# Altium footprint library Standard.PcbLib: 149 footprints (part 4 of 10)
Each footprint in its own frame and in the unit in brackets; x right, y up, seen from the top. Pads: shape width x height; smd on the part's side, far side on the other; paste and mask are expansions set on the pad; w line width, h text height; cw(c..) or ccw(c..) is an arc to the next point about the centre after c.
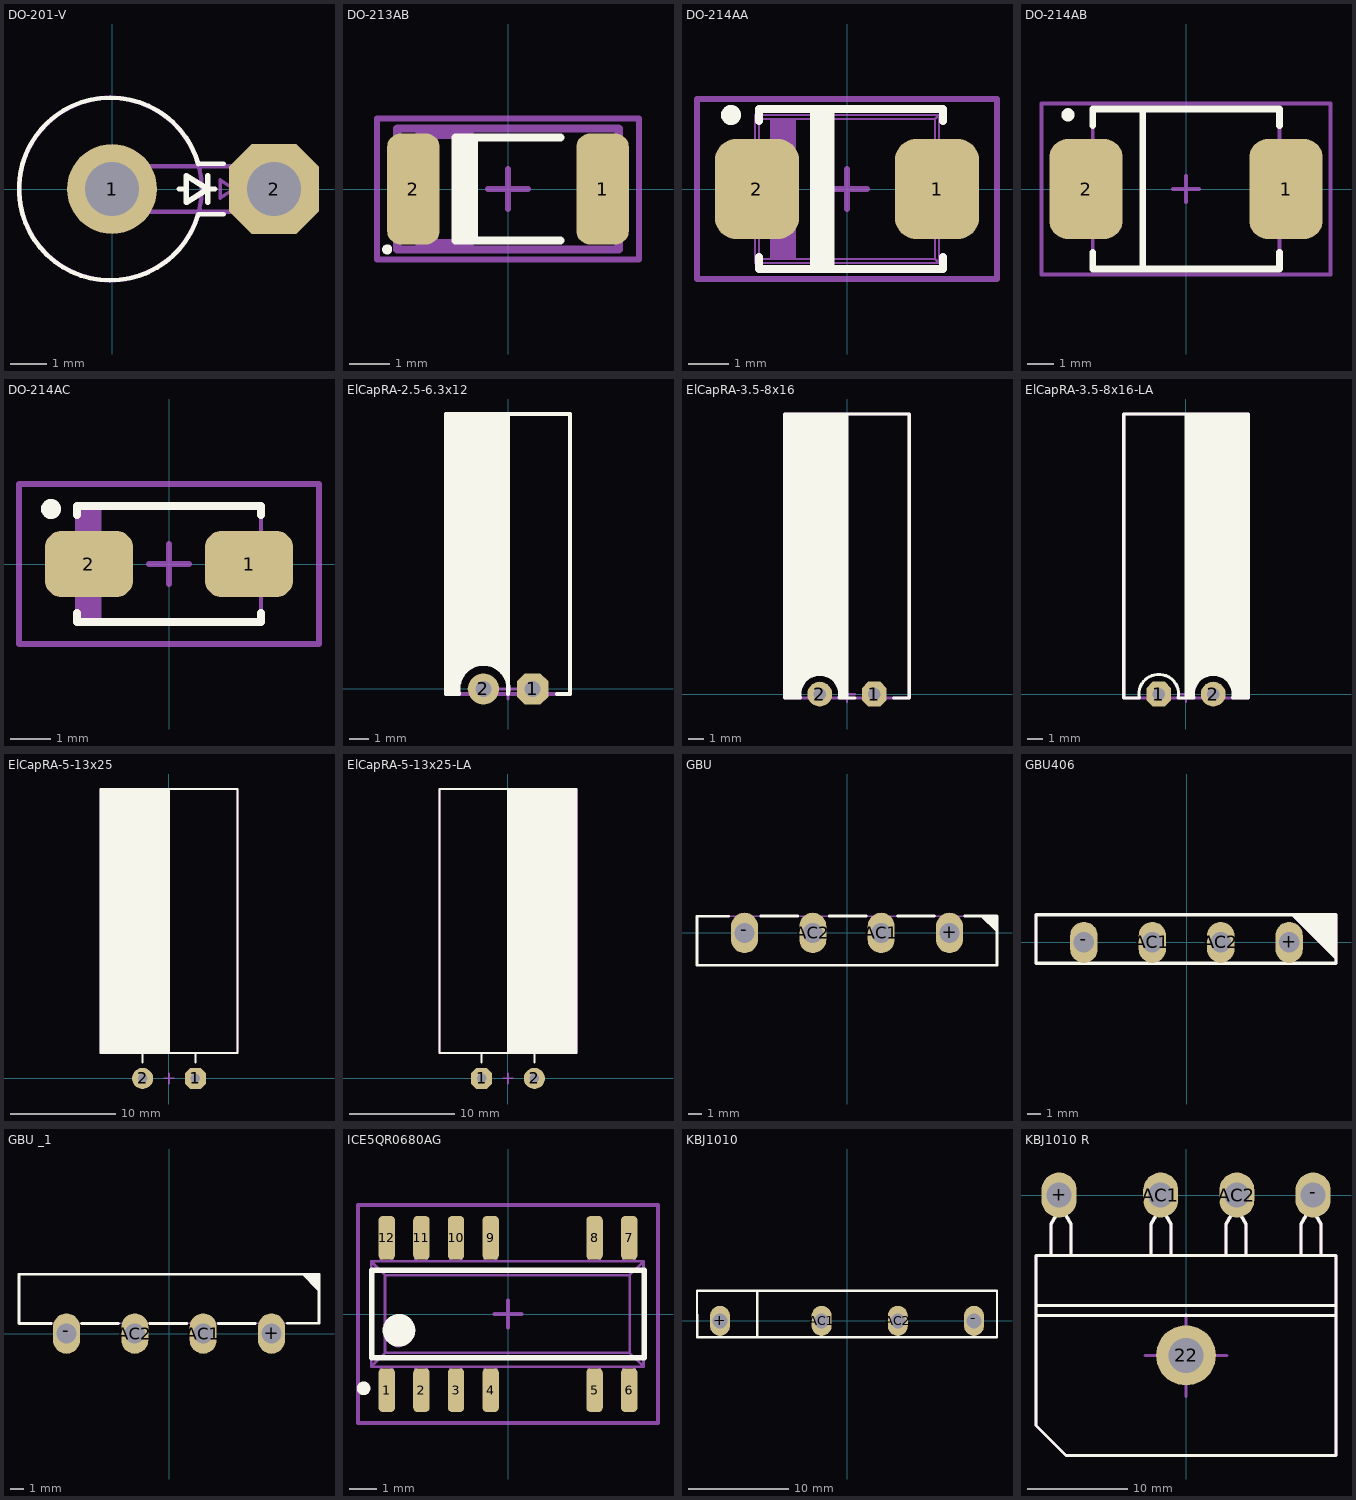
[diagram p3: the footprints below, top view; thin cyan lines are the x and y axes]

## DO-201-V [mm]
pads (2):
  round 2.5 hole 1.5: 1(0,0)
  oct 2.5x2.5 hole 1.5: 2(4.5,0)
Top Overlay:
  lines w0.125: 2.397,-0.699 cw(c-0.045,0) 2.399,0.692 ; 2.4,-0.7 3.1,-0.7 ; 2.4,0.7 3.1,0.7
  lines w0.15: 1.86,0 2.06,0 ; 2.06,-0.371 2.06,0.376 2.66,0 ; 2.065,-0.376 2.66,0 ; 2.66,-0.373 2.66,0.373 ; 2.86,0 2.66,0
Top Assembly:
  circle w0.125: c-0.045,0 r2.535
  lines w0.1: 3.389,-0.254 3.389,0.254 ; 3.008,-0.254 3.008,0.254 3.389,0 3.008,-0.254
  lines w0.125: 4.913,-0.635 ccw(c4.913,0) 4.913,0.635 ; 5.04,-0.635 -0.04,-0.635 cw(c-0.04,0) -0.04,0.635 5.04,0.635
3D body "DO-201-200 Ver.STEP": height 11.55, standoff -1.55, extent -2.84,-2.8 5.64,2.8

## DO-213AB [mm] "MELF Diode, 2-Leads, Body 5,00x2,50mm, IPC Medium Density"
height 2.6
pads (2):
  rrect50% 1.3x2.75 smd: 1(2.35,0) 2(-2.35,0)
Top Overlay:
  circle w0.15: c-3,-1.5 r0.05
  region: -0.75,1.275 -1.3,1.275 -1.3,-1.275 -0.75,-1.275
  lines w0.2: 1.3,-1.275 -1.3,-1.275 -1.3,1.275 1.3,1.275
Top Assembly:
  region: -1.75,1.5 -2.3,1.5 -2.3,-1.5 -1.75,-1.5
  region: -1.75,-1.25 -1,-1.25 -0.75,-1.5 -1.75,-1.5
  region: -1.75,1.25 -1,1.25 -0.75,1.5 -1.75,1.5
  lines w0.2: -2.75,-1.5 2.75,-1.5 2.75,1.5 -2.75,1.5 -2.75,-1.5
Top Component Outline:
  lines w0.15: -0.5,0 0.5,0 ; 0,-0.5 0,0.5 ; -3.25,-1.75 3.25,-1.75 3.25,1.75 -3.25,1.75 -3.25,-1.75
3D body "MELF.STEP": height 2.5, standoff 0, extent -2.616,-1.25 2.384,1.25

## DO-214AA [mm] "SMB, Molded Diode, 2-Leads, Body 4,33x3,65mm, IPC Medium Density"
height 2.4
pads (2):
  rrect50% 2.1x2.5 smd: 1(2.25,0) 2(-2.25,0)
Top Overlay:
  circle w0.25: c-2.9,1.85 r0.125
  rectangle: -0.93,-2 -0.311,2
  lines w0.2: -2.2,-1.7 -2.2,-2 2.4,-2 2.4,-1.7 ; -2.2,1.7 -2.2,2 2.4,2 2.4,1.7
Top Assembly:
  region: -1.3,1.75 -1.9,1.75 -1.9,-1.75 -1.3,-1.75
  lines w0.05: -2.4,-1 -2.3,-1 ; -2.4,-1 -2.65,-1 -2.65,1 -2.4,1 ; -2.4,-1 -2.4,1 ; -2.4,1 -2.3,1 ; -2.3,-1.85 -2.2,-1.75 ; -2.3,-1.85 -2.3,-1 ; -2.3,-1.85 2.3,-1.85 ; -2.3,-1 -2.3,1 ; -2.3,1 -2.3,1.85 ; -2.3,1.85 -2.2,1.75 ; -2.3,1.85 2.3,1.85 ; -2.2,-1.75 -2.2,1.75 ; -2.2,-1.75 -1.9,-1.75 ; -2.2,1.75 -1.9,1.75 ; -1.9,-1.75 -1.3,-1.75 ; -1.9,-1.75 -1.9,1.75 ; -1.9,1.75 -1.3,1.75 ; -1.3,-1.75 -1.3,1.75 ; -1.3,-1.75 2.2,-1.75 ; -1.3,1.75 2.2,1.75 ; 2.2,-1.75 2.3,-1.85 ; 2.2,-1.75 2.2,1.75 ; 2.2,1.75 2.3,1.85 ; 2.3,-1.85 2.3,-1 ; 2.3,-1 2.4,-1 ; 2.3,-1 2.3,1 ; 2.3,1 2.3,1.85 ; 2.3,1 2.4,1 ; 2.4,-1 2.65,-1 2.65,1 2.4,1 ; 2.4,-1 2.4,1
Top Component Outline:
  lines w0.15: -0.5,0 0.5,0 ; 0,-0.5 0,0.5 ; -3.75,-2.25 3.75,-2.25 3.75,2.25 -3.75,2.25 -3.75,-2.25
3D body "SMB (DO-214AA).STEP": height 2.2, standoff -0.05, extent -2.65,-1.85 2.65,1.85

## DO-214AB [mil] "SMC"
height 94.49
pads (2):
  rrect50% 110x150 smd: 1(150,0) 2(-150,0)
Top Overlay:
  circle w10: c-177.01,111.27 r4.92
  lines w10: -139.84,-95 -139.84,-120 140.16,-120 140.16,-95 ; -139.84,95 -139.84,120 140.16,120 140.16,95 ; -64.84,-120 -64.84,120
Top Assembly:
  lines w5.91: -64.84,-120 -64.84,120 ; -139.84,-120 140.16,-120 140.16,120 -139.84,120 -139.84,-120
Top Component Outline:
  lines w5.91: -19.69,0.08 19.68,0.08 ; 0,-19.61 0,19.76 ; -216.54,-127.95 216.54,-127.95 216.54,127.95 -216.54,127.95 -216.54,-127.95
3D body "User Library-DIOM8261X24.STEP": height 94.49, standoff 1.29, extent -160.04,-120 160.04,120.16

## DO-214AC [mm] "SMA 2-Leads, Body 2,55x5,00mm, IPC Medium Density"
height 1.1
pads (2):
  rrect50% 2.2x1.65 smd: 1(2,0) 2(-2,0)
Top Overlay:
  circle w0.25: c-2.95,1.375 r0.125
  lines w0.2: -2.3,-1.225 -2.3,-1.45 2.3,-1.45 2.3,-1.225 ; -2.3,1.225 -2.3,1.45 2.3,1.45 2.3,1.225
Top Assembly:
  rectangle: -2.3,-1.45 -1.681,1.45
  lines w0.1: -2.3,-1.45 2.3,-1.45 2.3,1.45 -2.3,1.45 -2.3,-1.45
Top Component Outline:
  lines w0.15: -0.5,0 0.5,0 ; 0,-0.5 0,0.5 ; -3.75,-2 3.75,-2 3.75,2 -3.75,2 -3.75,-2
3D body "User Library-S1G-1.step": height 2.7, standoff 0, extent -2.8,-1.475 2.8,1.475

## ElCapRA-2.5-6.3x12 [mm]
height 12
pads (2):
  oct 1.6x1.6 hole 0.8: 1(1.25,0)
  round 1.6 hole 0.8: 2(-1.25,0)
Top Overlay:
  region: 0,14 -3.15,14 -3.15,1.25 0,1.25
  rectangle: -3.125,-0.25 -2.5,1.5
  region: -2.725,1.625 -1.375,1.625 -3.063,-0.063
  region: -0.125,1.406 -0.868,1.406 0.061,0.478
  lines w0.2: 0,14.001 0,-0.25 ccw(c-1.25,0) -2.5,-0.25 -3.15,-0.25 -3.15,14 3.15,14 3.15,-0.25 2.5,-0.25
Top Assembly:
  lines w0.2: -3.151,-0.25 3.15,-0.25 3.15,14.001 -3.151,14.001 -3.151,-0.25
Top Component Outline:
  lines w0.15: -0.5,0 0.5,0 ; 0,-0.5 0,0.5
3D body "ElCapRA-2.5-6.3x12.step": height 6.4, standoff -3, extent -3.151,-0.249 3.15,14.001

## ElCapRA-3.5-8x16 [mm]
height 12
pads (2):
  oct 1.6x1.6 hole 0.8: 1(1.75,0)
  round 1.6 hole 0.8: 2(-1.75,0)
Top Overlay:
  region: 0,18 -4,18 -4,1.2 0,1.2
  region: 0,1.5 -0.5,1.5 -0.5,-0.25 0,-0.25
  rectangle: -4,-0.25 -3,1.5
  region: -0.5,1.5 -1.5,1.5 -0.25,0.25
  region: -3,1.5 -2,1.5 -3.25,0.25
  lines w0.2: 0,-0.25 0,18 ; 0.5,-0.25 -0.5,-0.25 ccw(c-1.75,0) -3,-0.25 ; 3,-0.25 4,-0.25 4,18 -4,18 ; -4,-0.25 -4,18 ; -4,-0.25 -3,-0.25 ; -4,-0.25 -4,18 ; -4,-0.25 -3,-0.25
Top Assembly:
  lines w0.2: -4,-0.25 -4,18 ; -4,-0.25 -4,18 ; -4,-0.25 4,-0.25 4,18 -4,18
Top Component Outline:
  lines w0.15: -0.5,0 0.5,0 ; 0,-0.5 0,0.5
3D body "ElCapRA-3.5-8x16.step": height 8.1, standoff -3, extent -4.001,-0.249 4,18.001

## ElCapRA-3.5-8x16-LA [mm]
height 12
pads (2):
  oct 1.6x1.6 hole 0.8: 1(-1.75,0)
  round 1.6 hole 0.8: 2(1.75,0)
Top Overlay:
  rectangle: 0,1.2 4,18
  rectangle: 0,-0.25 0.5,1.5
  region: 4,1.5 3,1.5 3,-0.25 4,-0.25
  region: 0.5,1.5 1.5,1.5 0.25,0.25
  region: 3,1.5 2,1.5 3.25,0.25
  lines w0.2: -4,-0.25 -4,18 ; -4,-0.25 -3,-0.25 ; -4,-0.25 -4,18 ; -4,-0.25 -3,-0.25 ; -4,18 4,18 ; -3,-0.25 cw(c-1.75,0) -0.5,-0.25 0.5,-0.25 cw(c1.75,0) 3,-0.25 ; 3,-0.25 4,-0.25 ; 3,-0.25 4,-0.25 ; 3,-0.25 4,-0.25 ; 4,-0.25 4,18 ; 4,-0.25 4,18 ; 4,-0.25 4,18 ; 0,-0.25 0,18 0,-0.25
Top Assembly:
  lines w0.2: -4,-0.25 -4,18 ; -4,-0.25 -4,18 ; -4,-0.25 4,-0.25 4,18 -4,18
Top Component Outline:
  lines w0.15: -0.5,0 0.5,0 ; 0,-0.5 0,0.5
3D body "ElCapLA-3.5-8x16.step": height 8.1, standoff -3, extent -4,-0.249 4.001,18.001

## ElCapRA-5-13x25 [mm]
height 25
pads (2):
  oct 2x2 hole 0.9: 1(2.5,0)
  round 2 hole 0.9: 2(-2.5,0)
Top Overlay:
  rectangle: -6.5,2.401 0,27.401
  lines w0.2: -2.5,1.5 -2.5,2.401 ; 0.001,2.401 0.001,27.401 ; 2.5,1.5 2.5,2.401 ; -6.5,2.401 6.501,2.401 6.501,27.401 -6.5,27.401 -6.5,2.401
Top Assembly:
  lines w0.2: -6.5,2.401 6.501,2.401 6.501,27.401 -6.5,27.401 -6.5,2.401
Top Component Outline:
  lines w0.15: -0.5,0 0.5,0 ; 0,-0.5 0,0.5
3D body "ElCapRA-5.0-13x25.step": height 13.1, standoff -3, extent -6.501,-0.299 6.5,27.401

## ElCapRA-5-13x25-LA [mm]
height 25
pads (2):
  oct 2x2 hole 0.9: 1(-2.5,0)
  round 2 hole 0.9: 2(2.5,0)
Top Overlay:
  rectangle: 0.001,2.401 6.5,27.401
  lines w0.2: -2.5,1.5 -2.5,2.401 ; 0.001,2.401 0.001,27.401 ; 2.5,1.5 2.5,2.401 ; -6.5,2.401 -6.5,27.401 6.501,27.401 6.501,2.401 -6.5,2.401
Top Assembly:
  lines w0.2: -6.5,2.401 -6.5,27.401 6.501,27.401 6.501,2.401 -6.5,2.401
Top Component Outline:
  lines w0.15: -0.5,0 0.5,0 ; 0,-0.5 0,0.5
3D body "ElCapLA-5.0-13x25.step": height 13.1, standoff -3, extent -6.5,-0.299 6.501,27.401

## GBU [mm]
pads (4):
  oval 2x3 hole 1.5: +(7.62,0) -(-7.62,0) AC1(2.54,0) AC2(-2.54,0)
Top Overlay:
  region: 9.91,1.25 11.15,1.25 11.15,0.06 11.125,0.035
  lines w0.2: -8.8,1.23 -11.15,1.23 -11.15,-2.41 11.15,-2.41 11.15,1.25 8.758,1.25 ; -6.41,1.25 -3.66,1.25 ; -1.33,1.25 1.42,1.25 ; 3.75,1.25 6.5,1.25
Top Assembly:
  region: 11.15,1.25 11.15,0.3 11.1,0.3 10.15,1.25
  lines w0.1: -11.15,-2.41 -11.15,1.25 11.15,1.25 11.15,-2.41 10.91,-2.41 -11.15,-2.41
3D body "GBU.stp": height 22, standoff -4.55, extent -11.15,-2.41 11.15,1.25

## GBU406 [mm]
pads (4):
  oval 2x3 hole 1.5: +(7.5,0) -(-7.5,0) AC1(-2.5,0) AC2(2.5,0)
Top Overlay:
  region: 10.922,2.032 10.922,-1.27 7.62,2.032
  lines w0.254: -11,-1.524 -11,2.032 6.858,2.032 10.922,2.032 10.922,-1.524 -11,-1.524
Top Assembly:
  region: 10.922,2.032 10.922,-1.27 7.62,2.032
  lines w0.2: -11,-1.524 -11,2.032 10.922,2.032 10.922,-1.524 -11,-1.524
3D body "User Library-Silicon Bridge Rectifiers GBU406.step": height 25.25, standoff -11.25, extent -11,-1.524 11,2.026

## GBU _1 [mm]
pads (4):
  oval 2x3 hole 1.5: +(7.62,0) -(-7.62,0) AC1(2.54,0) AC2(-2.54,0)
Top Overlay:
  region: 9.86,4.4 11.1,4.4 11.1,3.21 11.075,3.185
  lines w0.2: -8.758,0.75 -11.15,0.75 -11.15,4.41 11.15,4.41 11.15,0.77 8.8,0.77 ; -6.5,0.75 -3.75,0.75 ; -1.42,0.75 1.33,0.75 ; 3.66,0.75 6.41,0.75
Top Assembly:
  region: 11.15,4.41 11.15,3.46 11.1,3.46 10.15,4.41
  lines w0.1: -11.15,0.75 11.15,0.75 11.15,4.41 -10.91,4.41 -11.15,4.41 -11.15,0.75
3D body "User Library-GBU10A-1.STEP": height 23.8, standoff 5, extent -11.15,0.75 11.15,4.36

## ICE5QR0680AG [mm] "SOIC, 12-Leads, ICE5QR0680AG"
height 1.75
pads (12):
  rrect50% 0.6x1.6 smd: 1(-4.458,-2.794) 2(-3.188,-2.794) 3(-1.918,-2.794) 4(-0.648,-2.794) 5(3.162,-2.794) 6(4.432,-2.794) 7(4.432,2.794) 8(3.162,2.794) 9(-0.648,2.794) 10(-1.918,2.794) 11(-3.188,2.794) 12(-4.458,2.794)
Top Overlay:
  circle w0.25: c-5.308,-2.725 r0.125
  circle w0.6: c-4.013,-0.6 r0.3
  lines w0.2: -5.013,-1.6 4.987,-1.6 4.987,1.6 -5.013,1.6 -5.013,-1.6
Top Assembly:
  drawing of 212 lines, arcs and shapes, not listed
Top Component Outline:
  lines w0.15: -0.513,0 0.487,0 ; -0.013,-0.5 -0.013,0.5 ; -5.513,-4 5.487,-4 5.487,4 -5.513,4 -5.513,-4
3D body "ICE5QR0680AG.STEP": height 1.7, standoff -0.05, extent -5.013,-2.9 4.987,2.9

## KBJ1010 [mm]
pads (4):
  oval 2x3 hole 1.5: +(-12.7,0) -(12.7,0) AC1(-2.54,0) AC2(5.08,0)
Top Overlay:
  lines w0.2: -9,-1.625 -9,3 ; -15,-1.625 15,-1.625 15,3 -15,3 -15,-1.625
  lines w0.25: -9,-1.625 -9,3 ; -15,-1.625 15,-1.625 15,3 -15,3 -15,-1.625
3D body "User Library-Silicon Bridge Rectifiers KBJ1010.step": height 23.85, standoff -13.35, extent -15,-1.8 15,3

## KBJ1010 R [mm]
pads (5):
  round 6 hole 3.5: 22(-0.009,-16.043)
  oval 3.5x4.5 hole 2.5: +(-12.7,0) -(12.7,0) AC1(-2.54,0) AC2(5.08,0)
Top Overlay:
  lines w0.3: -13.509,-6.043 -13.509,-2.909 -13.009,-2.043 -13.009,-0.343 ; -11.509,-6.043 -11.509,-2.909 -12.009,-2.043 -12.009,-0.343 ; -3.509,-6.043 -3.509,-2.909 -3.009,-2.043 -3.009,-0.343 ; -1.509,-6.043 -1.509,-2.909 -2.009,-2.043 -2.009,-0.343 ; 3.991,-6.043 3.991,-2.909 4.491,-2.043 4.491,-0.343 ; 5.991,-6.043 5.991,-2.909 5.491,-2.043 5.491,-0.343 ; 11.491,-6.043 11.491,-2.909 11.991,-2.043 11.991,-0.343 ; 13.491,-6.043 13.491,-2.909 12.991,-2.043 12.991,-0.343 ; -15.009,-12.043 14.991,-12.043 ; -15.009,-12.043 -15.009,-11.043 ; -15.009,-12.043 -15.009,-23.043 -12.009,-26.043 14.991,-26.043 14.991,-12.043 ; -15.009,-11.043 -15.009,-6.043 14.991,-6.043 14.991,-11.043 ; -15.009,-11.043 14.991,-11.043 ; -13.009,-0.343 -13.009,0.007 ; -13.009,-0.343 -12.009,-0.343 ; -13.009,0.007 -13.009,0.707 -12.609,0.707 ; -13.009,0.007 -12.609,0.007 ; -12.609,0.007 -12.609,0.707 ; -12.609,0.007 -12.409,0.007 ; -12.609,0.707 -12.409,0.707 ; -12.409,0.007 -12.409,0.707 ; -12.409,0.007 -12.009,0.007 ; -12.409,0.707 -12.009,0.707 -12.009,0.007 ; -12.009,-0.343 -12.009,0.007 ; -3.009,-0.343 -3.009,0.007 ; -3.009,-0.343 -2.009,-0.343 ; -3.009,0.007 -3.009,0.707 -2.609,0.707 ; -3.009,0.007 -2.609,0.007 ; -2.609,0.007 -2.609,0.707 ; -2.609,0.007 -2.409,0.007 ; -2.609,0.707 -2.409,0.707 ; -2.409,0.007 -2.409,0.707 ; -2.409,0.007 -2.009,0.007 ; -2.409,0.707 -2.009,0.707 -2.009,0.007 ; -2.009,-0.343 -2.009,0.007 ; 4.491,-0.343 4.491,0.007 ; 4.491,-0.343 5.491,-0.343 ; 4.491,0.007 4.491,0.707 4.891,0.707 ; 4.491,0.007 4.891,0.007 ; 4.891,0.007 4.891,0.707 ; 4.891,0.007 5.091,0.007 ; 4.891,0.707 5.091,0.707 ; 5.091,0.007 5.091,0.707 ; 5.091,0.007 5.491,0.007 ; 5.091,0.707 5.491,0.707 5.491,0.007 ; 5.491,-0.343 5.491,0.007 ; 11.991,-0.343 11.991,0.007 ; 11.991,-0.343 12.991,-0.343 ; 11.991,0.007 11.991,0.707 12.391,0.707 ; 11.991,0.007 12.391,0.007 ; 12.391,0.007 12.391,0.707 ; 12.391,0.007 12.591,0.007 ; 12.391,0.707 12.591,0.707 ; 12.591,0.007 12.591,0.707 ; 12.591,0.007 12.991,0.007 ; 12.591,0.707 12.991,0.707 12.991,0.007 ; 12.991,-0.343 12.991,0.007 ; 14.991,-12.043 14.991,-11.043
Top Assembly:
  circle w0.3: c-0.009,-16.043 r1.6
  lines w0.3: -13.509,-6.043 -13.509,-2.909 -13.009,-2.043 -13.009,-0.343 ; -11.509,-6.043 -11.509,-2.909 -12.009,-2.043 -12.009,-0.343 ; -4.109,-16.043 -2.509,-16.043 -0.009,-16.043 ; -3.509,-6.043 -3.509,-2.909 -3.009,-2.043 -3.009,-0.343 ; -1.509,-6.043 -1.509,-2.909 -2.009,-2.043 -2.009,-0.343 ; -0.009,-20.143 -0.009,-18.543 -0.009,-16.043 ; -0.009,-11.943 -0.009,-13.543 -0.009,-16.043 ; 3.991,-6.043 3.991,-2.909 4.491,-2.043 4.491,-0.343 ; 4.091,-16.043 2.491,-16.043 -0.009,-16.043 ; 5.991,-6.043 5.991,-2.909 5.491,-2.043 5.491,-0.343 ; 11.491,-6.043 11.491,-2.909 11.991,-2.043 11.991,-0.343 ; 13.491,-6.043 13.491,-2.909 12.991,-2.043 12.991,-0.343 ; -15.009,-12.043 -15.009,-23.043 -12.009,-26.043 14.991,-26.043 14.991,-12.043 ; -15.009,-12.043 -15.009,-11.043 ; -15.009,-12.043 14.991,-12.043 ; -15.009,-11.043 14.991,-11.043 ; -15.009,-11.043 -15.009,-6.043 14.991,-6.043 14.991,-11.043 ; -13.009,-0.343 -12.009,-0.343 ; -13.009,-0.343 -13.009,0.007 ; -13.009,0.007 -12.609,0.007 ; -13.009,0.007 -13.009,0.707 -12.609,0.707 ; -12.609,0.007 -12.409,0.007 ; -12.609,0.007 -12.609,0.707 ; -12.609,0.707 -12.409,0.707 ; -12.409,0.007 -12.009,0.007 ; -12.409,0.007 -12.409,0.707 ; -12.409,0.707 -12.009,0.707 -12.009,0.007 ; -12.009,-0.343 -12.009,0.007 ; -3.009,-0.343 -2.009,-0.343 ; -3.009,-0.343 -3.009,0.007 ; -3.009,0.007 -2.609,0.007 ; -3.009,0.007 -3.009,0.707 -2.609,0.707 ; -2.609,0.007 -2.409,0.007 ; -2.609,0.007 -2.609,0.707 ; -2.609,0.707 -2.409,0.707 ; -2.409,0.007 -2.009,0.007 ; -2.409,0.007 -2.409,0.707 ; -2.409,0.707 -2.009,0.707 -2.009,0.007 ; -2.009,-0.343 -2.009,0.007 ; 4.491,-0.343 5.491,-0.343 ; 4.491,-0.343 4.491,0.007 ; 4.491,0.007 4.891,0.007 ; 4.491,0.007 4.491,0.707 4.891,0.707 ; 4.891,0.007 5.091,0.007 ; 4.891,0.007 4.891,0.707 ; 4.891,0.707 5.091,0.707 ; 5.091,0.007 5.491,0.007 ; 5.091,0.007 5.091,0.707 ; 5.091,0.707 5.491,0.707 5.491,0.007 ; 5.491,-0.343 5.491,0.007 ; 11.991,-0.343 12.991,-0.343 ; 11.991,-0.343 11.991,0.007 ; 11.991,0.007 12.391,0.007 ; 11.991,0.007 11.991,0.707 12.391,0.707 ; 12.391,0.007 12.591,0.007 ; 12.391,0.007 12.391,0.707 ; 12.391,0.707 12.591,0.707 ; 12.591,0.007 12.991,0.007 ; 12.591,0.007 12.591,0.707 ; 12.591,0.707 12.991,0.707 12.991,0.007 ; 12.991,-0.343 12.991,0.007 ; 14.991,-12.043 14.991,-11.043
3D body "User Library-bridge-15A-V.step": height 10, standoff -4.15, extent -15,-26.5 15,0.25